# Altium schematic symbol library LATTICEPLDS_Library.SchLib: 291 symbols (part 1 of 32)
Pins are listed as number, name and electrical type; pins without a type are passive.

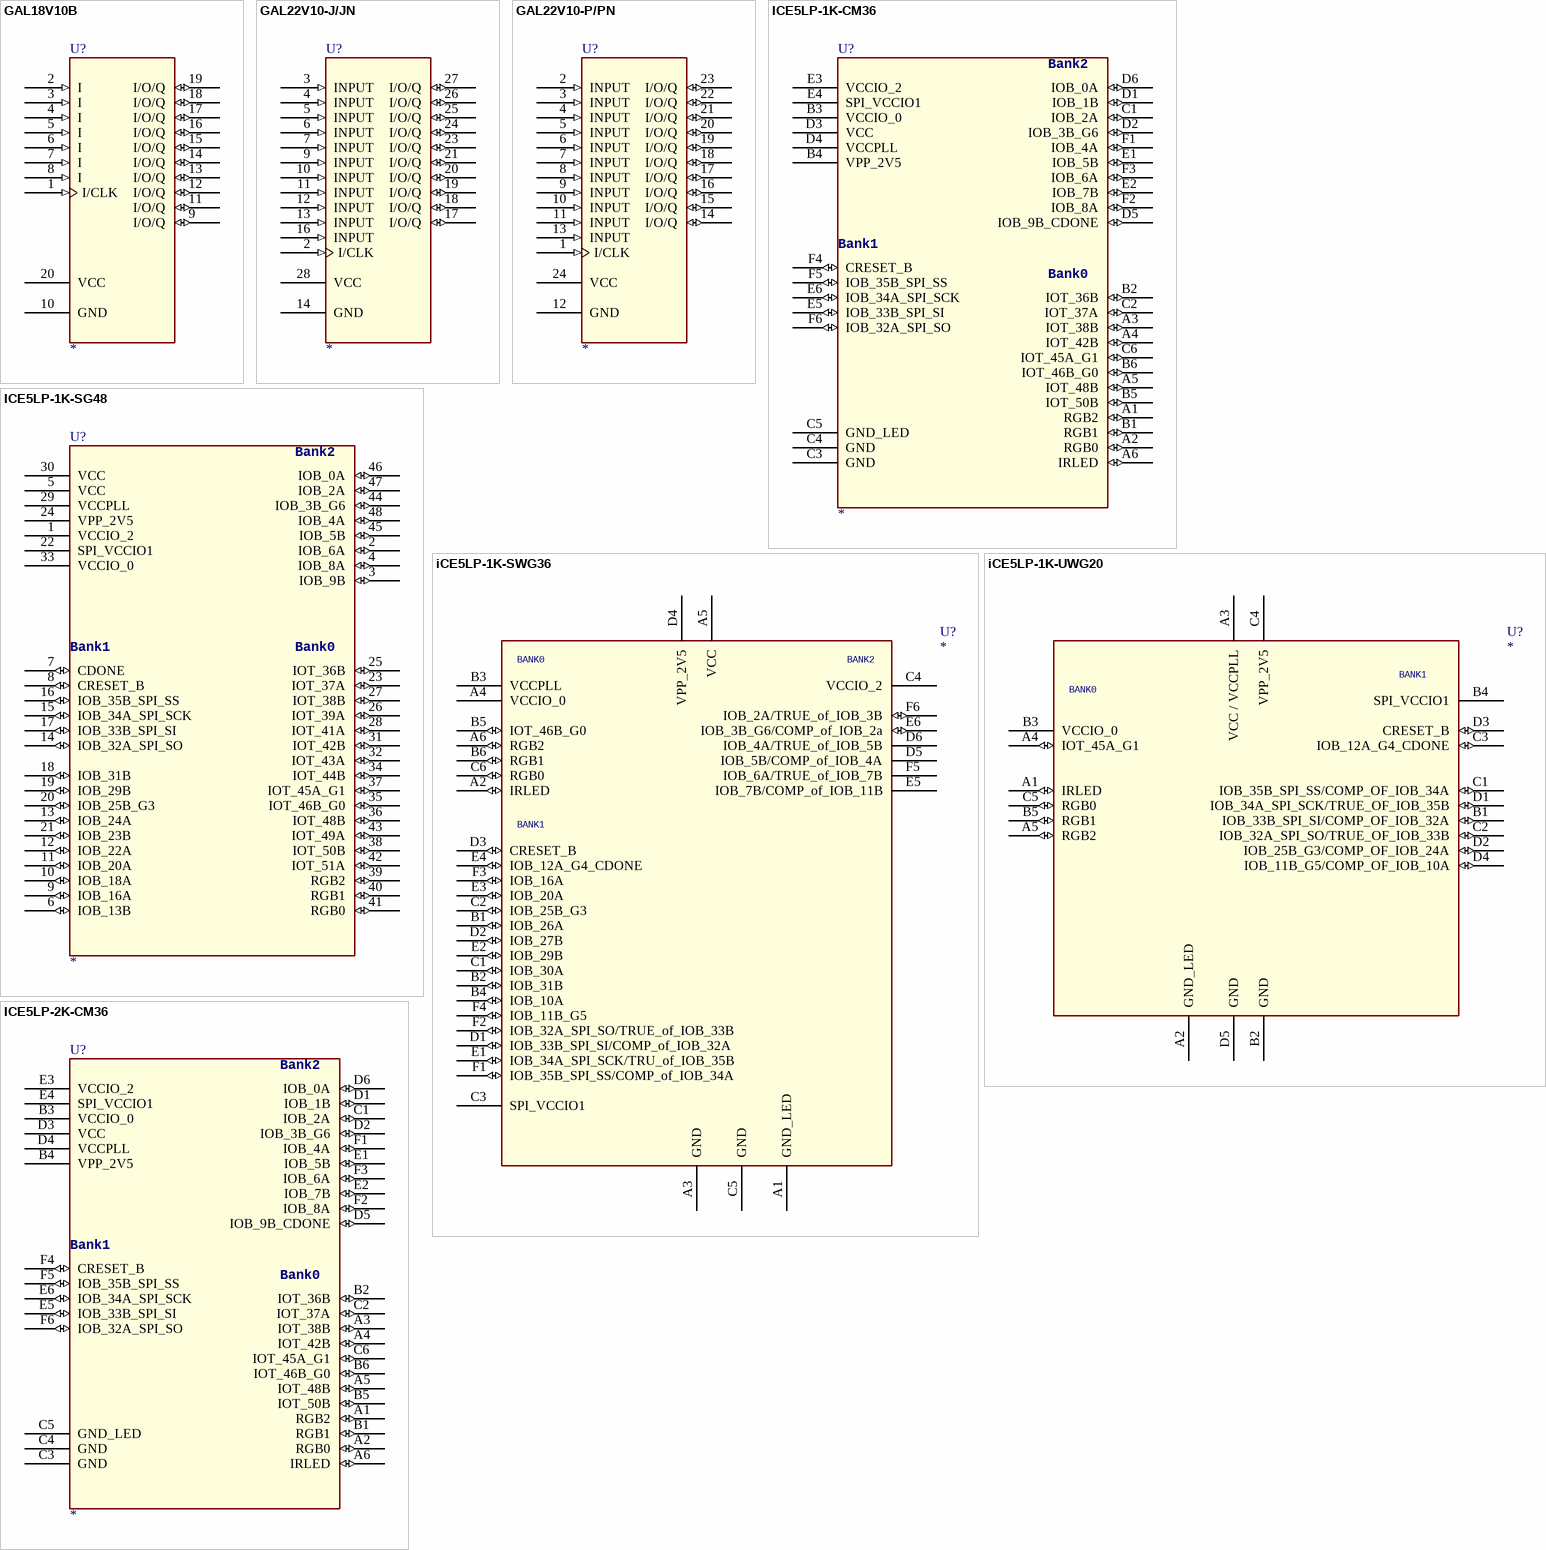
[diagram p0: symbols GAL18V10B to ICE5LP-2K-CM36]

## GAL18V10B
designator U?
pins: 1 I/CLK (in), 2 I (in), 3 I (in), 4 I (in), 5 I (in), 6 I (in), 7 I (in), 8 I (in), 9 I/O/Q (io), 10 GND (power), 11 I/O/Q (io), 12 I/O/Q (io), 13 I/O/Q (io), 14 I/O/Q (io), 15 I/O/Q (io), 16 I/O/Q (io), 17 I/O/Q (io), 18 I/O/Q (io), 19 I/O/Q (io), 20 VCC (power)

## GAL22V10-J/JN
designator U?
footprint DIP24
pins: 2 I/CLK (in), 3 INPUT (in), 4 INPUT (in), 5 INPUT (in), 6 INPUT (in), 7 INPUT (in), 9 INPUT (in), 10 INPUT (in), 11 INPUT (in), 12 INPUT (in), 13 INPUT (in), 14 GND (power), 16 INPUT (in), 17 I/O/Q (io), 18 I/O/Q (io), 19 I/O/Q (io), 20 I/O/Q (io), 21 I/O/Q (io), 23 I/O/Q (io), 24 I/O/Q (io), 25 I/O/Q (io), 26 I/O/Q (io), 27 I/O/Q (io), 28 VCC (power)

## GAL22V10-P/PN
designator U?
footprint DIP24
pins: 1 I/CLK (in), 2 INPUT (in), 3 INPUT (in), 4 INPUT (in), 5 INPUT (in), 6 INPUT (in), 7 INPUT (in), 8 INPUT (in), 9 INPUT (in), 10 INPUT (in), 11 INPUT (in), 12 GND (power), 13 INPUT (in), 14 I/O/Q (io), 15 I/O/Q (io), 16 I/O/Q (io), 17 I/O/Q (io), 18 I/O/Q (io), 19 I/O/Q (io), 20 I/O/Q (io), 21 I/O/Q (io), 22 I/O/Q (io), 23 I/O/Q (io), 24 VCC (power)

## ICE5LP-1K-CM36
designator U?
pins: A1 RGB2 (io), A2 RGB0 (io), A3 IOT_38B (io), A4 IOT_42B (io), A5 IOT_48B (io), A6 IRLED (io), B1 RGB1 (io), B2 IOT_36B (io), B3 VCCIO_0 (power), B4 VPP_2V5 (power), B5 IOT_50B (io), B6 IOT_46B_G0 (io), C1 IOB_2A (io), C2 IOT_37A (io), C3 GND (power), C4 GND (power), C5 GND_LED (power), C6 IOT_45A_G1 (io), D1 IOB_1B (io), D2 IOB_3B_G6 (io), D3 VCC (power), D4 VCCPLL (power), D5 IOB_9B_CDONE (io), D6 IOB_0A (io), E1 IOB_5B (io), E2 IOB_7B (io), E3 VCCIO_2 (power), E4 SPI_VCCIO1 (power), E5 IOB_33B_SPI_SI (io), E6 IOB_34A_SPI_SCK (io), F1 IOB_4A (io), F2 IOB_8A (io), F3 IOB_6A (io), F4 CRESET_B (io), F5 IOB_35B_SPI_SS (io), F6 IOB_32A_SPI_SO (io)
text: Bank2; Bank1; Bank0

## ICE5LP-1K-SG48
designator U?
pins: 1 VCCIO_2 (power), 2 IOB_6A (io), 3 IOB_9B (io), 4 IOB_8A (io), 5 VCC (power), 6 IOB_13B (io), 7 CDONE (io), 8 CRESET_B (io), 9 IOB_16A (io), 10 IOB_18A (io), 11 IOB_20A (io), 12 IOB_22A (io), 13 IOB_24A (io), 14 IOB_32A_SPI_SO (io), 15 IOB_34A_SPI_SCK (io), 16 IOB_35B_SPI_SS (io), 17 IOB_33B_SPI_SI (io), 18 IOB_31B (io), 19 IOB_29B (io), 20 IOB_25B_G3 (io), 21 IOB_23B (io), 22 SPI_VCCIO1 (power), 23 IOT_37A (io), 24 VPP_2V5 (power), 25 IOT_36B (io), 26 IOT_39A (io), 27 IOT_38B (io), 28 IOT_41A (io), 29 VCCPLL (power), 30 VCC (power), 31 IOT_42B (io), 32 IOT_43A (io), 33 VCCIO_0 (power), 34 IOT_44B (io), 35 IOT_46B_G0 (io), 36 IOT_48B (io), 37 IOT_45A_G1 (io), 38 IOT_50B (io), 39 RGB2 (io), 40 RGB1 (io), 41 RGB0 (io), 42 IOT_51A (io), 43 IOT_49A (io), 44 IOB_3B_G6 (io), 45 IOB_5B (io), 46 IOB_0A (io), 47 IOB_2A (io), 48 IOB_4A (io)
text: Bank2; Bank1; Bank0

## iCE5LP-1K-SWG36
designator U?
pins: A1 GND_LED (power), A2 IRLED (io), A3 GND (power), A4 VCCIO_0 (power), A5 VCC (power), A6 RGB2 (io), B1 IOB_26A (io), B2 IOB_31B (io), B3 VCCPLL (power), B4 IOB_10A (io), B5 IOT_46B_G0 (io), B6 RGB1 (io), C1 IOB_30A (io), C2 IOB_25B_G3 (io), C3 SPI_VCCIO1 (power), C4 VCCIO_2 (power), C5 GND (power), C6 RGB0 (io), D1 IOB_33B_SPI_SI/COMP_of_IOB_32A (io), D2 IOB_27B (io), D3 CRESET_B (io), D4 VPP_2V5 (power), D5 IOB_5B/COMP_of_IOB_4A (power), D6 IOB_4A/TRUE_of_IOB_5B (power), E1 IOB_34A_SPI_SCK/TRU_of_IOB_35B (io), E2 IOB_29B (io), E3 IOB_20A (io), E4 IOB_12A_G4_CDONE (io), E5 IOB_7B/COMP_of_IOB_11B (power), E6 IOB_3B_G6/COMP_of_IOB_2a (io), F1 IOB_35B_SPI_SS/COMP_of_IOB_34A (io), F2 IOB_32A_SPI_SO/TRUE_of_IOB_33B (io), F3 IOB_16A (io), F4 IOB_11B_G5 (io), F5 IOB_6A/TRUE_of_IOB_7B (power), F6 IOB_2A/TRUE_of_IOB_3B (io)
text: BANK0; BANK2; BANK1

## iCE5LP-1K-UWG20
designator U?
pins: A1 IRLED (io), A2 GND_LED (power), A3 VCC / VCCPLL (power), A4 IOT_45A_G1 (io), A5 RGB2 (io), B1 IOB_33B_SPI_SI/COMP_OF_IOB_32A (io), B2 GND (power), B3 VCCIO_0 (power), B4 SPI_VCCIO1 (power), B5 RGB1 (io), C1 IOB_35B_SPI_SS/COMP_OF_IOB_34A (io), C2 IOB_32A_SPI_SO/TRUE_OF_IOB_33B (io), C3 IOB_12A_G4_CDONE (io), C4 VPP_2V5 (power), C5 RGB0 (io), D1 IOB_34A_SPI_SCK/TRUE_OF_IOB_35B (io), D2 IOB_25B_G3/COMP_OF_IOB_24A (io), D3 CRESET_B (io), D4 IOB_11B_G5/COMP_OF_IOB_10A (io), D5 GND (power)
text: BANK1; BANK0

## ICE5LP-2K-CM36
designator U?
pins: A1 RGB2 (io), A2 RGB0 (io), A3 IOT_38B (io), A4 IOT_42B (io), A5 IOT_48B (io), A6 IRLED (io), B1 RGB1 (io), B2 IOT_36B (io), B3 VCCIO_0 (power), B4 VPP_2V5 (power), B5 IOT_50B (io), B6 IOT_46B_G0 (io), C1 IOB_2A (io), C2 IOT_37A (io), C3 GND (power), C4 GND (power), C5 GND_LED (power), C6 IOT_45A_G1 (io), D1 IOB_1B (io), D2 IOB_3B_G6 (io), D3 VCC (power), D4 VCCPLL (power), D5 IOB_9B_CDONE (io), D6 IOB_0A (io), E1 IOB_5B (io), E2 IOB_7B (io), E3 VCCIO_2 (power), E4 SPI_VCCIO1 (power), E5 IOB_33B_SPI_SI (io), E6 IOB_34A_SPI_SCK (io), F1 IOB_4A (io), F2 IOB_8A (io), F3 IOB_6A (io), F4 CRESET_B (io), F5 IOB_35B_SPI_SS (io), F6 IOB_32A_SPI_SO (io)
text: Bank2; Bank1; Bank0

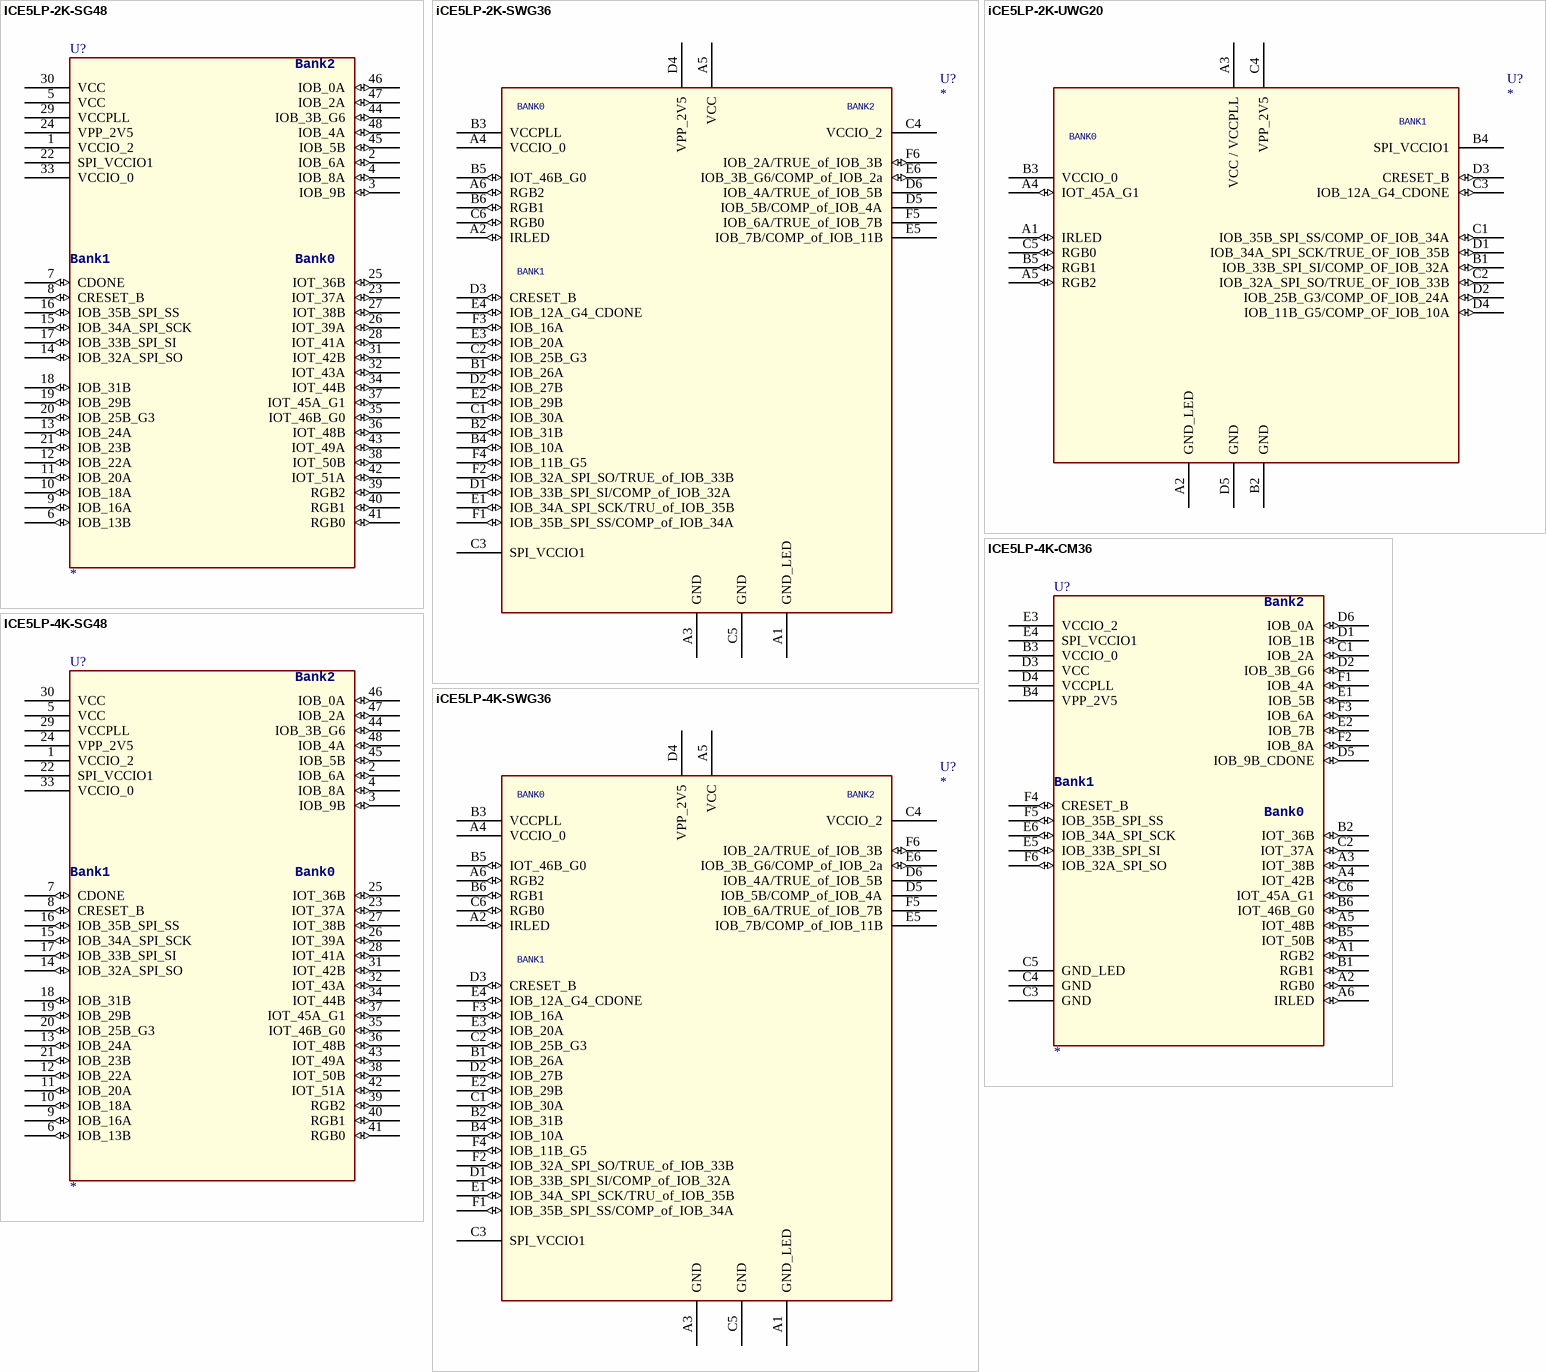
[diagram p1: symbols ICE5LP-2K-SG48 to iCE5LP-4K-SWG36]

## ICE5LP-2K-SG48
designator U?
pins: 1 VCCIO_2 (power), 2 IOB_6A (io), 3 IOB_9B (io), 4 IOB_8A (io), 5 VCC (power), 6 IOB_13B (io), 7 CDONE (io), 8 CRESET_B (io), 9 IOB_16A (io), 10 IOB_18A (io), 11 IOB_20A (io), 12 IOB_22A (io), 13 IOB_24A (io), 14 IOB_32A_SPI_SO (io), 15 IOB_34A_SPI_SCK (io), 16 IOB_35B_SPI_SS (io), 17 IOB_33B_SPI_SI (io), 18 IOB_31B (io), 19 IOB_29B (io), 20 IOB_25B_G3 (io), 21 IOB_23B (io), 22 SPI_VCCIO1 (power), 23 IOT_37A (io), 24 VPP_2V5 (power), 25 IOT_36B (io), 26 IOT_39A (io), 27 IOT_38B (io), 28 IOT_41A (io), 29 VCCPLL (power), 30 VCC (power), 31 IOT_42B (io), 32 IOT_43A (io), 33 VCCIO_0 (power), 34 IOT_44B (io), 35 IOT_46B_G0 (io), 36 IOT_48B (io), 37 IOT_45A_G1 (io), 38 IOT_50B (io), 39 RGB2 (io), 40 RGB1 (io), 41 RGB0 (io), 42 IOT_51A (io), 43 IOT_49A (io), 44 IOB_3B_G6 (io), 45 IOB_5B (io), 46 IOB_0A (io), 47 IOB_2A (io), 48 IOB_4A (io)
text: Bank2; Bank1; Bank0

## iCE5LP-2K-SWG36
designator U?
pins: A1 GND_LED (power), A2 IRLED (io), A3 GND (power), A4 VCCIO_0 (power), A5 VCC (power), A6 RGB2 (io), B1 IOB_26A (io), B2 IOB_31B (io), B3 VCCPLL (power), B4 IOB_10A (io), B5 IOT_46B_G0 (io), B6 RGB1 (io), C1 IOB_30A (io), C2 IOB_25B_G3 (io), C3 SPI_VCCIO1 (power), C4 VCCIO_2 (power), C5 GND (power), C6 RGB0 (io), D1 IOB_33B_SPI_SI/COMP_of_IOB_32A (io), D2 IOB_27B (io), D3 CRESET_B (io), D4 VPP_2V5 (power), D5 IOB_5B/COMP_of_IOB_4A (power), D6 IOB_4A/TRUE_of_IOB_5B (power), E1 IOB_34A_SPI_SCK/TRU_of_IOB_35B (io), E2 IOB_29B (io), E3 IOB_20A (io), E4 IOB_12A_G4_CDONE (io), E5 IOB_7B/COMP_of_IOB_11B (power), E6 IOB_3B_G6/COMP_of_IOB_2a (io), F1 IOB_35B_SPI_SS/COMP_of_IOB_34A (io), F2 IOB_32A_SPI_SO/TRUE_of_IOB_33B (io), F3 IOB_16A (io), F4 IOB_11B_G5 (io), F5 IOB_6A/TRUE_of_IOB_7B (power), F6 IOB_2A/TRUE_of_IOB_3B (io)
text: BANK0; BANK2; BANK1

## iCE5LP-2K-UWG20
designator U?
pins: A1 IRLED (io), A2 GND_LED (power), A3 VCC / VCCPLL (power), A4 IOT_45A_G1 (io), A5 RGB2 (io), B1 IOB_33B_SPI_SI/COMP_OF_IOB_32A (io), B2 GND (power), B3 VCCIO_0 (power), B4 SPI_VCCIO1 (power), B5 RGB1 (io), C1 IOB_35B_SPI_SS/COMP_OF_IOB_34A (io), C2 IOB_32A_SPI_SO/TRUE_OF_IOB_33B (io), C3 IOB_12A_G4_CDONE (io), C4 VPP_2V5 (power), C5 RGB0 (io), D1 IOB_34A_SPI_SCK/TRUE_OF_IOB_35B (io), D2 IOB_25B_G3/COMP_OF_IOB_24A (io), D3 CRESET_B (io), D4 IOB_11B_G5/COMP_OF_IOB_10A (io), D5 GND (power)
text: BANK1; BANK0

## ICE5LP-4K-CM36
designator U?
pins: A1 RGB2 (io), A2 RGB0 (io), A3 IOT_38B (io), A4 IOT_42B (io), A5 IOT_48B (io), A6 IRLED (io), B1 RGB1 (io), B2 IOT_36B (io), B3 VCCIO_0 (power), B4 VPP_2V5 (power), B5 IOT_50B (io), B6 IOT_46B_G0 (io), C1 IOB_2A (io), C2 IOT_37A (io), C3 GND (power), C4 GND (power), C5 GND_LED (power), C6 IOT_45A_G1 (io), D1 IOB_1B (io), D2 IOB_3B_G6 (io), D3 VCC (power), D4 VCCPLL (power), D5 IOB_9B_CDONE (io), D6 IOB_0A (io), E1 IOB_5B (io), E2 IOB_7B (io), E3 VCCIO_2 (power), E4 SPI_VCCIO1 (power), E5 IOB_33B_SPI_SI (io), E6 IOB_34A_SPI_SCK (io), F1 IOB_4A (io), F2 IOB_8A (io), F3 IOB_6A (io), F4 CRESET_B (io), F5 IOB_35B_SPI_SS (io), F6 IOB_32A_SPI_SO (io)
text: Bank2; Bank1; Bank0

## ICE5LP-4K-SG48
designator U?
pins: 1 VCCIO_2 (power), 2 IOB_6A (io), 3 IOB_9B (io), 4 IOB_8A (io), 5 VCC (power), 6 IOB_13B (io), 7 CDONE (io), 8 CRESET_B (io), 9 IOB_16A (io), 10 IOB_18A (io), 11 IOB_20A (io), 12 IOB_22A (io), 13 IOB_24A (io), 14 IOB_32A_SPI_SO (io), 15 IOB_34A_SPI_SCK (io), 16 IOB_35B_SPI_SS (io), 17 IOB_33B_SPI_SI (io), 18 IOB_31B (io), 19 IOB_29B (io), 20 IOB_25B_G3 (io), 21 IOB_23B (io), 22 SPI_VCCIO1 (power), 23 IOT_37A (io), 24 VPP_2V5 (power), 25 IOT_36B (io), 26 IOT_39A (io), 27 IOT_38B (io), 28 IOT_41A (io), 29 VCCPLL (power), 30 VCC (power), 31 IOT_42B (io), 32 IOT_43A (io), 33 VCCIO_0 (power), 34 IOT_44B (io), 35 IOT_46B_G0 (io), 36 IOT_48B (io), 37 IOT_45A_G1 (io), 38 IOT_50B (io), 39 RGB2 (io), 40 RGB1 (io), 41 RGB0 (io), 42 IOT_51A (io), 43 IOT_49A (io), 44 IOB_3B_G6 (io), 45 IOB_5B (io), 46 IOB_0A (io), 47 IOB_2A (io), 48 IOB_4A (io)
text: Bank2; Bank1; Bank0

## iCE5LP-4K-SWG36
designator U?
pins: A1 GND_LED (power), A2 IRLED (io), A3 GND (power), A4 VCCIO_0 (power), A5 VCC (power), A6 RGB2 (io), B1 IOB_26A (io), B2 IOB_31B (io), B3 VCCPLL (power), B4 IOB_10A (io), B5 IOT_46B_G0 (io), B6 RGB1 (io), C1 IOB_30A (io), C2 IOB_25B_G3 (io), C3 SPI_VCCIO1 (power), C4 VCCIO_2 (power), C5 GND (power), C6 RGB0 (io), D1 IOB_33B_SPI_SI/COMP_of_IOB_32A (io), D2 IOB_27B (io), D3 CRESET_B (io), D4 VPP_2V5 (power), D5 IOB_5B/COMP_of_IOB_4A (power), D6 IOB_4A/TRUE_of_IOB_5B (power), E1 IOB_34A_SPI_SCK/TRU_of_IOB_35B (io), E2 IOB_29B (io), E3 IOB_20A (io), E4 IOB_12A_G4_CDONE (io), E5 IOB_7B/COMP_of_IOB_11B (power), E6 IOB_3B_G6/COMP_of_IOB_2a (io), F1 IOB_35B_SPI_SS/COMP_of_IOB_34A (io), F2 IOB_32A_SPI_SO/TRUE_of_IOB_33B (io), F3 IOB_16A (io), F4 IOB_11B_G5 (io), F5 IOB_6A/TRUE_of_IOB_7B (power), F6 IOB_2A/TRUE_of_IOB_3B (io)
text: BANK0; BANK2; BANK1

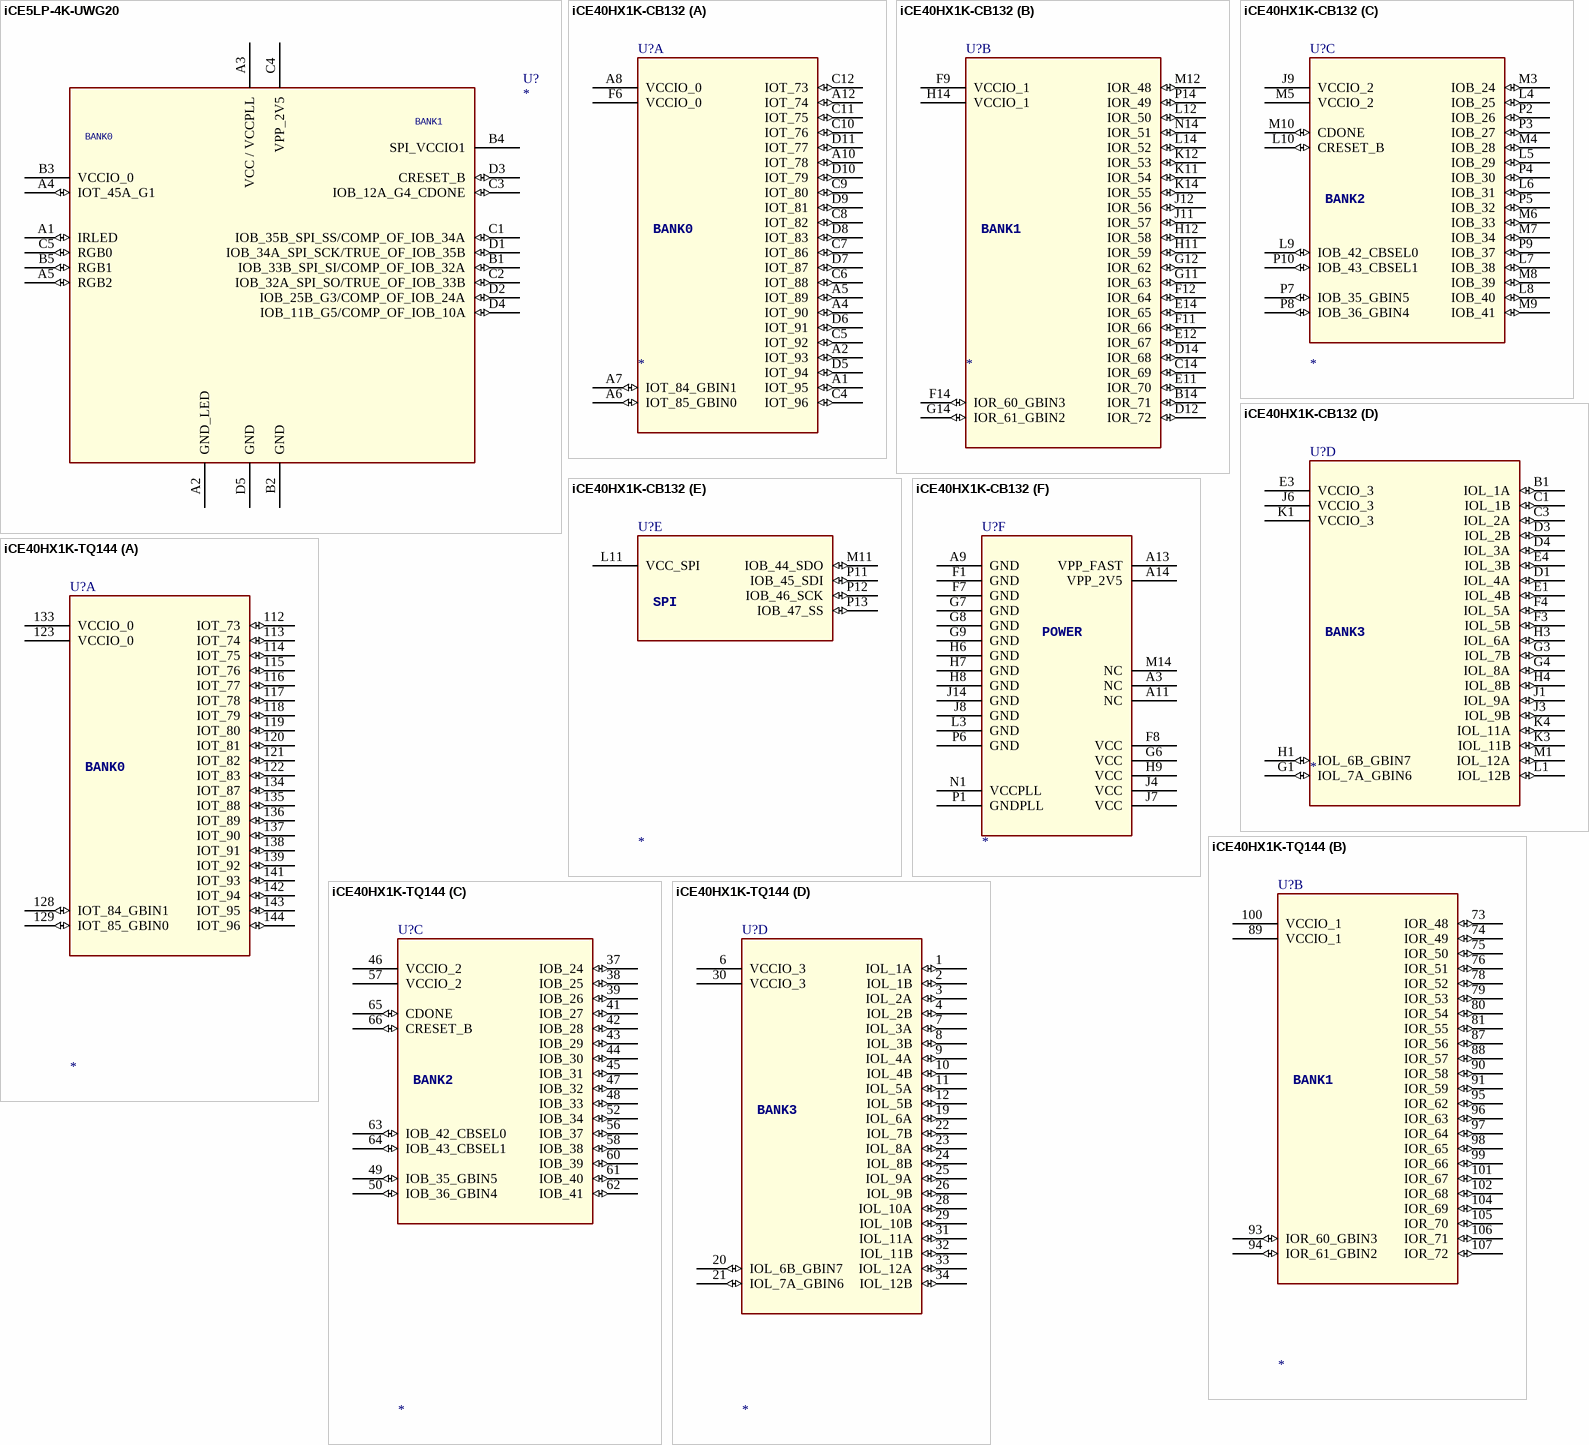
[diagram p2: symbols iCE5LP-4K-UWG20 to iCE40HX1K-TQ144]

## iCE5LP-4K-UWG20
designator U?
pins: A1 IRLED (io), A2 GND_LED (power), A3 VCC / VCCPLL (power), A4 IOT_45A_G1 (io), A5 RGB2 (io), B1 IOB_33B_SPI_SI/COMP_OF_IOB_32A (io), B2 GND (power), B3 VCCIO_0 (power), B4 SPI_VCCIO1 (power), B5 RGB1 (io), C1 IOB_35B_SPI_SS/COMP_OF_IOB_34A (io), C2 IOB_32A_SPI_SO/TRUE_OF_IOB_33B (io), C3 IOB_12A_G4_CDONE (io), C4 VPP_2V5 (power), C5 RGB0 (io), D1 IOB_34A_SPI_SCK/TRUE_OF_IOB_35B (io), D2 IOB_25B_G3/COMP_OF_IOB_24A (io), D3 CRESET_B (io), D4 IOB_11B_G5/COMP_OF_IOB_10A (io), D5 GND (power)
text: BANK1; BANK0

## iCE40HX1K-CB132
designator U?
SWAP_INFO: (S1+S2+S3+S4+S5+S6); SPLIT_INST: TRUE
part A pins: A1 IOT_95 (io), A2 IOT_93 (io), A4 IOT_90 (io), A5 IOT_89 (io), A6 IOT_85_GBIN0 (io), A7 IOT_84_GBIN1 (io), A8 VCCIO_0 (power), A10 IOT_78 (io), A12 IOT_74 (io), C4 IOT_96 (io), C5 IOT_92 (io), C6 IOT_88 (io), C7 IOT_86 (io), C8 IOT_82 (io), C9 IOT_80 (io), C10 IOT_76 (io), C11 IOT_75 (io), C12 IOT_73 (io), D5 IOT_94 (io), D6 IOT_91 (io), D7 IOT_87 (io), D8 IOT_83 (io), D9 IOT_81 (io), D10 IOT_79 (io), D11 IOT_77 (io), F6 VCCIO_0 (power)
part B pins: B14 IOR_71 (io), C14 IOR_69 (io), D12 IOR_72 (io), D14 IOR_68 (io), E11 IOR_70 (io), E12 IOR_67 (io), E14 IOR_65 (io), F9 VCCIO_1 (power), F11 IOR_66 (io), F12 IOR_64 (io), F14 IOR_60_GBIN3 (io), G11 IOR_63 (io), G12 IOR_62 (io), G14 IOR_61_GBIN2 (io), H11 IOR_59 (io), H12 IOR_58 (io), H14 VCCIO_1 (power), J11 IOR_57 (io), J12 IOR_56 (io), K11 IOR_54 (io), K12 IOR_53 (io), K14 IOR_55 (io), L12 IOR_50 (io), L14 IOR_52 (io), M12 IOR_48 (io), N14 IOR_51 (io), P14 IOR_49 (io)
part C pins: J9 VCCIO_2 (power), L4 IOB_25 (io), L5 IOB_29 (io), L6 IOB_31 (io), L7 IOB_38 (io), L8 IOB_40 (io), L9 IOB_42_CBSEL0 (io), L10 CRESET_B (io), M3 IOB_24 (io), M4 IOB_28 (io), M5 VCCIO_2 (power), M6 IOB_33 (io), M7 IOB_34 (io), M8 IOB_39 (io), M9 IOB_41 (io), M10 CDONE (io), P2 IOB_26 (io), P3 IOB_27 (io), P4 IOB_30 (io), P5 IOB_32 (io), P7 IOB_35_GBIN5 (io), P8 IOB_36_GBIN4 (io), P9 IOB_37 (io), P10 IOB_43_CBSEL1 (io)
part D pins: B1 IOL_1A (io), C1 IOL_1B (io), C3 IOL_2A (io), D1 IOL_4A (io), D3 IOL_2B (io), D4 IOL_3A (io), E1 IOL_4B (io), E3 VCCIO_3 (power), E4 IOL_3B (io), F3 IOL_5B (io), F4 IOL_5A (io), G1 IOL_7A_GBIN6 (io), G3 IOL_7B (io), G4 IOL_8A (io), H1 IOL_6B_GBIN7 (io), H3 IOL_6A (io), H4 IOL_8B (io), J1 IOL_9A (io), J3 IOL_9B (io), J6 VCCIO_3 (power), K1 VCCIO_3 (power), K3 IOL_11B (io), K4 IOL_11A (io), L1 IOL_12B (io), M1 IOL_12A (io)
part E pins: L11 VCC_SPI (power), M11 IOB_44_SDO (io), P11 IOB_45_SDI (io), P12 IOB_46_SCK (io), P13 IOB_47_SS (io)
part F pins: A3 NC (power), A9 GND (power), A11 NC (power), A13 VPP_FAST (power), A14 VPP_2V5 (power), F1 GND (power), F7 GND (power), F8 VCC (power), G6 VCC (power), G7 GND (power), G8 GND (power), G9 GND (power), H6 GND (power), H7 GND (power), H8 GND (power), H9 VCC (power), J4 VCC (power), J7 VCC (power), J8 GND (power), J14 GND (power), L3 GND (power), M14 NC (power), N1 VCCPLL (power), P1 GNDPLL (power), P6 GND (power)
part A text: BANK0
part B text: BANK1
part C text: BANK2
part D text: BANK3
part E text: SPI
part F text: POWER

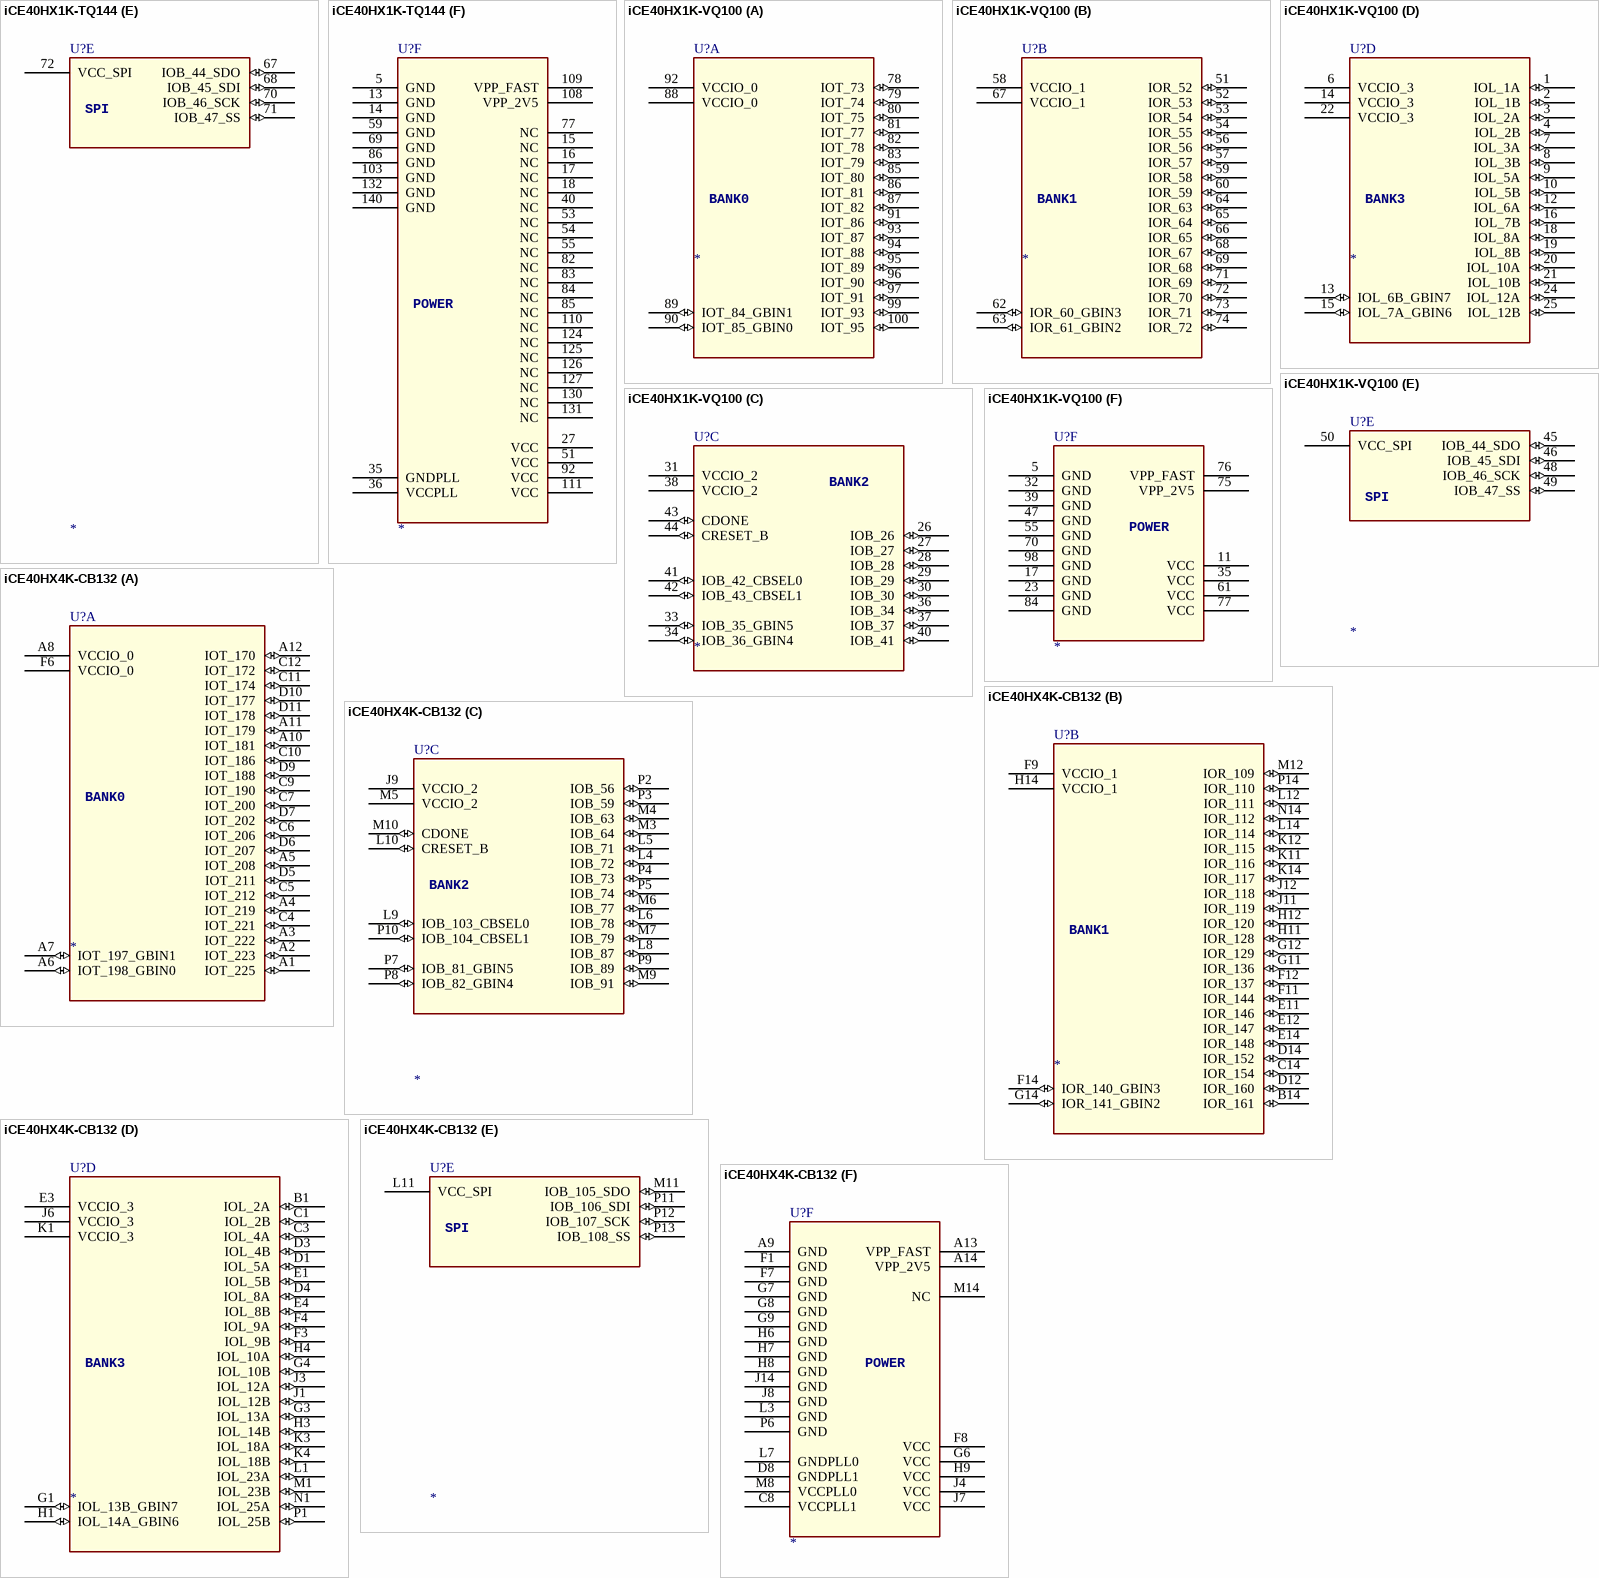
[diagram p3: symbols iCE40HX1K-TQ144 to iCE40HX4K-CB132]
